# Altium footprint library MODULE.PcbLib: 10 footprints
Each footprint in its own frame and in the unit in brackets; x right, y up, seen from the top. Pads: shape width x height; smd on the part's side, far side on the other; paste and mask are expansions set on the pad; w line width, h text height; cw(c..) or ccw(c..) is an arc to the next point about the centre after c.
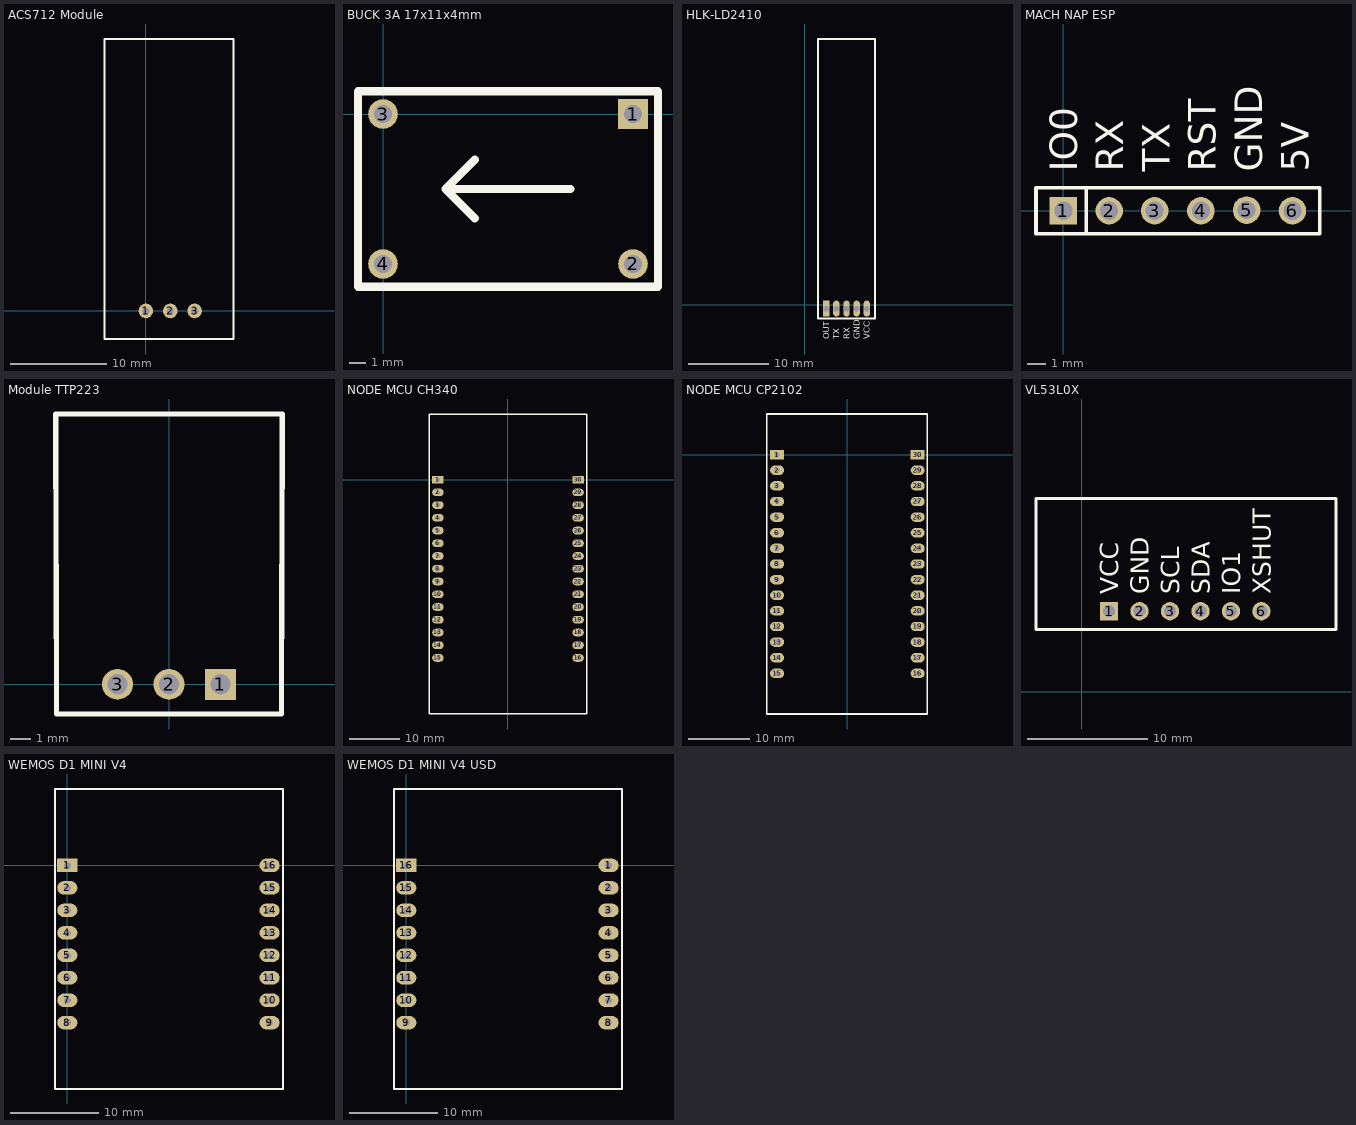
[diagram p0: the footprints below, top view; thin cyan lines are the x and y axes]

## ACS712 Module [mil]
pads (3):
  round 60 hole 30: 1(0,0) 2(100,0) 3(200,0)
Top Overlay:
  lines w7.87: -170,-115 -170,1115 360,1115 360,-115 -170,-115
3D body "acs712.STEP": height 531.89, standoff -55.04, extent -166.81,-114.17 356.81,1114.17

## BUCK 3A 17x11x4mm [mm] "DSN-MINI-360"
pads (4):
  rect 1.8x1.8 hole 1.1: 1(15.24,0)
  round 1.8 hole 1.1: 2(15.24,-9.144) 3(0,0) 4(0,-9.144)
Top Overlay:
  lines w0.508: 5.588,-6.35 3.81,-4.572 ; 5.588,-2.794 3.81,-4.572 ; 11.43,-4.572 3.81,-4.572 ; -1.524,-10.541 -1.524,1.397 16.764,1.397 16.764,-10.541 -1.524,-10.541
3D body "DSN Mini-360 Buck Converter.step": height 7.24, standoff -4.79, extent -1.38,-10.397 16.62,1.253

## HLK-LD2410 [mm]
pads (5):
  rect 0.8x2 hole 0.7: 1(2.667,-0.508)
  oval 0.8x2 hole 0.7: 2(3.937,-0.508) 3(5.207,-0.508) 4(6.477,-0.508) 5(7.747,-0.508)
Top Overlay:
  lines w0.254: 1.651,-1.778 8.763,-1.778 8.763,33.274 1.651,33.274 1.651,-1.778
  text "VCC" at 8.128,-4.318 h0.76
  text "GND" at 6.858,-4.318 h0.76
  text "RX" at 5.588,-4.318 h0.76
  text "TX" at 4.318,-4.318 h0.76
  text "OUT" at 3.048,-4.318 h0.76
3D body "HLK-2410B.step": height 2.1, standoff -0.05, extent 1.707,-1.778 8.707,33.222

## MACH NAP ESP [mil]
pads (6):
  rect 60x60 hole 39.37: 1(0,0)
  round 60 hole 39.37: 2(100,0) 3(199.21,0) 4(300,0) 5(400,1.33) 6(500,0)
Top Overlay:
  lines w7.87: 50,-50 50,50 ; -59.84,-50 -59.84,50 559.85,50 559.85,-50 -59.84,-50
  text "IO0" at 30,85 h60
  text "RX" at 131,85 h60
  text "TX" at 232,85 h60
  text "RST" at 333,85 h60
  text "GND" at 434,85 h60
  text "5V" at 535,85 h60
3D body "61300611821.stp": height 335.04, standoff -121.65, extent -59.84,-49.21 559.85,49.22

## Module TTP223 [mil]
pads (3):
  rect 60x60 hole 39.37: 1(100,0)
  round 60 hole 39.37: 2(0,0) 3(-100,0)
Top Overlay:
  lines w10: -220,525 -218.23,-57.67 218.23,-57.67 220,525 -220,525
3D body "touch button TTP223.SLDPRT": height 39.37, standoff -39.37, extent -206.69,-45.43 206.69,525.43

## NODE MCU CH340 [mil]
pads (30):
  rect 90x60 hole 31: 1(-550,0) 30(550,0)
  oval 90x60 hole 31: 2(-550,-100) 3(-550,-200) 4(-550,-300) 5(-550,-400) 6(-550,-500) 7(-550,-600) 8(-550,-700) 9(-550,-800) 10(-550,-900) 11(-550,-1000) 12(-550,-1100) 13(-550,-1200) 14(-550,-1300) 15(-550,-1400) 16(550,-1400) 17(550,-1300) 18(550,-1200) 19(550,-1100) 20(550,-1000) 21(550,-900) 22(550,-800) 23(550,-700) 24(550,-600) 25(550,-500) 26(550,-400) 27(550,-300) 28(550,-200) 29(550,-100)
Top Overlay:
  lines w10: -620,-1840 -620,515 620,515 620,-1840 -620,-1840
3D body "Lolin NodeMCU ESP8266 V3.STEP": height 299.21, standoff -218.11, extent -625,-1845.71 615.16,515.71

## NODE MCU CP2102 [mil]
pads (30):
  rect 90x60 hole 31: 1(-450,0) 30(450,0)
  oval 90x60 hole 31: 2(-450,-100) 3(-450,-200) 4(-450,-300) 5(-450,-400) 6(-450,-500) 7(-450,-600) 8(-450,-700) 9(-450,-800) 10(-450,-900) 11(-450,-1000) 12(-450,-1100) 13(-450,-1200) 14(-450,-1300) 15(-450,-1400) 16(450,-1400) 17(450,-1300) 18(450,-1200) 19(450,-1100) 20(450,-1000) 21(450,-900) 22(450,-800) 23(450,-700) 24(450,-600) 25(450,-500) 26(450,-400) 27(450,-300) 28(450,-200) 29(450,-100)
Top Overlay:
  lines w10: -515,-1660 -515,260 510,260 510,-1660 -515,-1660
3D body "+++ ESP8266 NodeMCU Board +++.stp": height 276.72, standoff -212.6, extent -505.71,-1655 505.71,253.86

## VL53L0X [mil]
pads (6):
  rect 60x60 hole 39.37: 1(90,265)
  round 60 hole 39.37: 2(190,265) 3(290,265) 4(390,265) 5(490,265) 6(590,265)
Top Overlay:
  lines w10: -150,205 -150,635 835,635 835,205 -150,205
  text "XSHUT" at 620,320 h60
  text "IO1" at 520,320 h60
  text "SDA" at 420,320 h60
  text "SCL" at 320,320 h60
  text "GND" at 220,320 h60
  text "VCC" at 120,320 h60
3D body "vl53l0x.STEP": height 207.09, standoff -237.8, extent -146.66,203.46 836.66,636.54

## WEMOS D1 MINI V4 [mil]
pads (16):
  rect 90x60 hole 31: 1(0,0)
  oval 90x60 hole 31: 2(0,-100) 3(0,-200) 4(0,-300) 5(0,-400) 6(0,-500) 7(0,-600) 8(0,-700) 9(900,-700) 10(900,-600) 11(900,-500) 12(900,-400) 13(900,-300) 14(900,-200) 15(900,-100) 16(900,0)
Top Overlay:
  lines w10: -55,-995 -55,340 960,340 960,-995 -55,-995
3D body "wemos d1 mini V4.STEP": height 169.99, standoff 6.61, extent -46.97,-991.42 956.97,333.39

## WEMOS D1 MINI V4 USD [mil]
pads (16):
  oval 90x60 hole 31: 1(900,0) 2(900,-100) 3(900,-200) 4(900,-300) 5(900,-400) 6(900,-500) 7(900,-600) 8(900,-700) 9(0,-700) 10(0,-600) 11(0,-500) 12(0,-400) 13(0,-300) 14(0,-200) 15(0,-100)
  rect 90x60 hole 31: 16(0,0)
Top Overlay:
  lines w10: -55,-995 -55,340 960,340 960,-995 -55,-995
3D body "wemos d1 mini V4.STEP": height 173.39, standoff 10.01, extent -46.97,-991.42 956.97,333.39